# Altium footprint library EwgMicrochips.PcbLib: 61 footprints (part 4 of 4)
Each footprint in its own frame and in the unit in brackets; x right, y up, seen from the top. Pads: shape width x height; smd on the part's side, far side on the other; paste and mask are expansions set on the pad; w line width, h text height; cw(c..) or ccw(c..) is an arc to the next point about the centre after c.
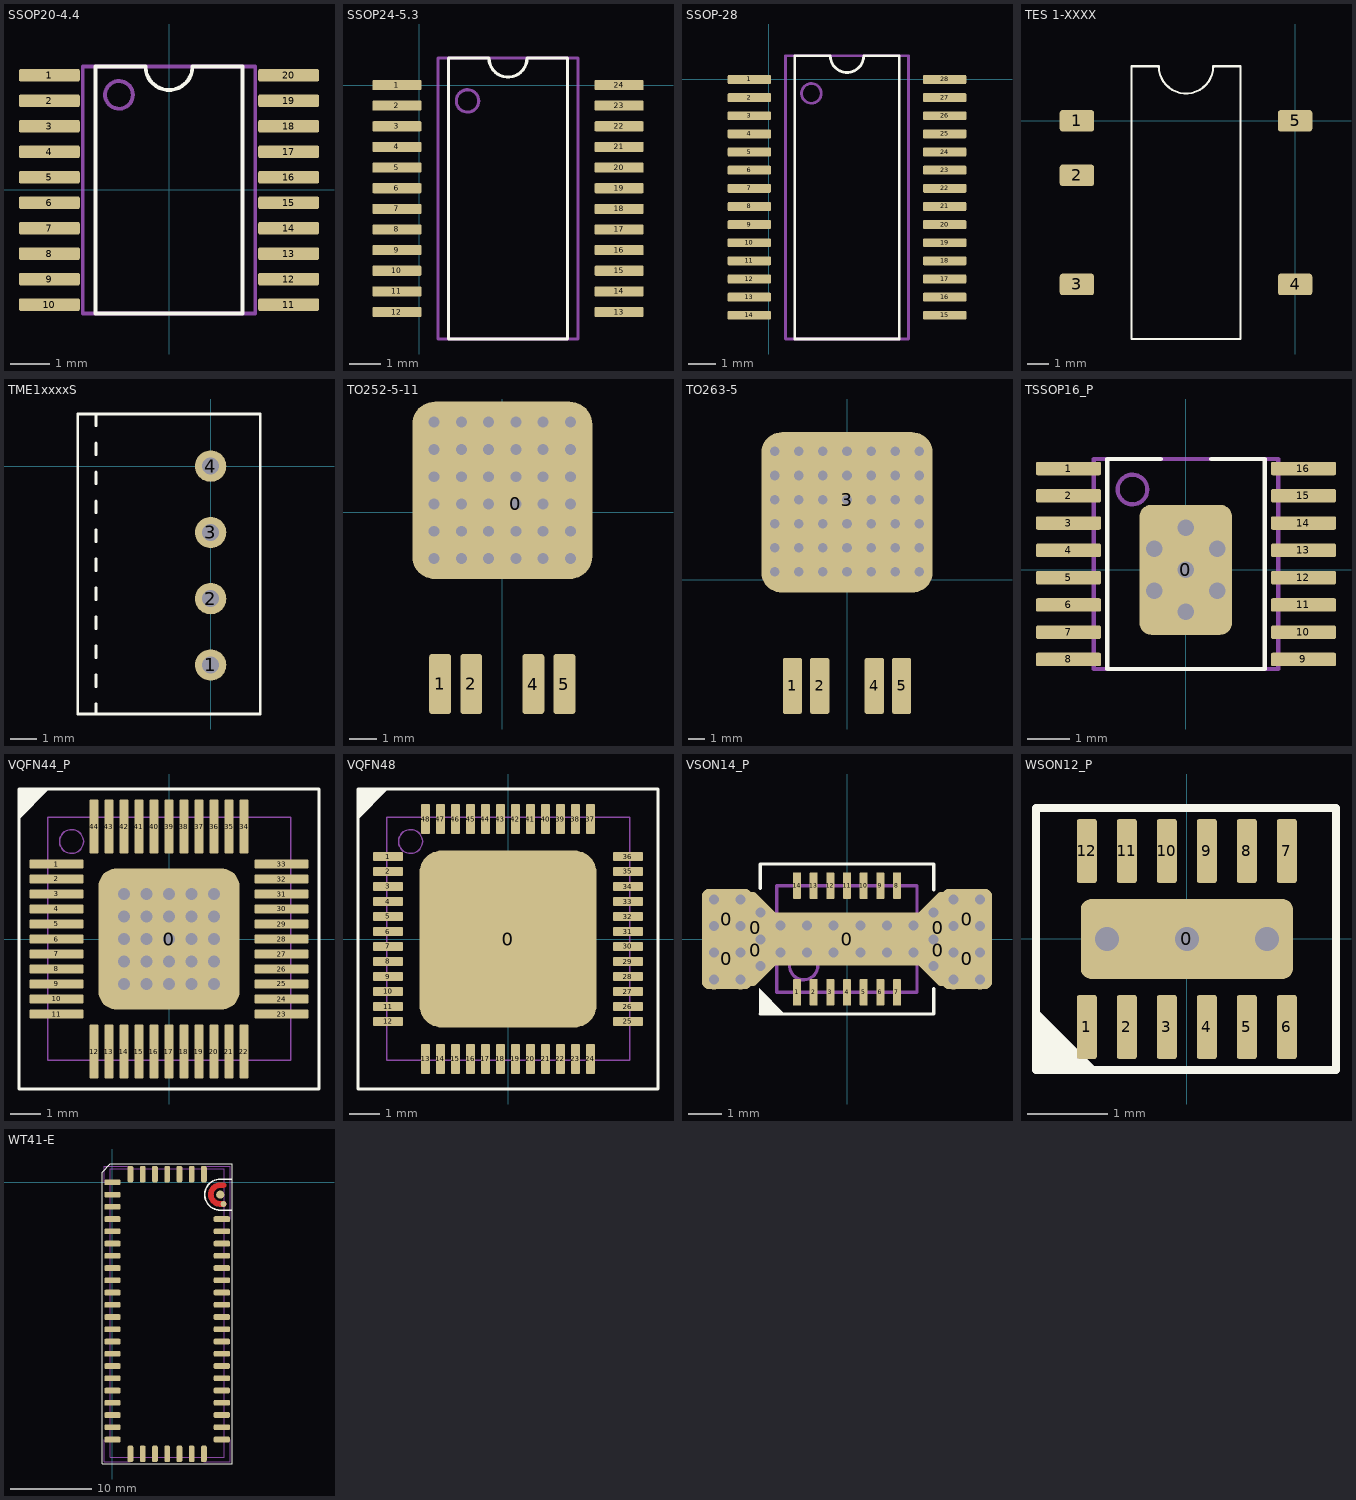
[diagram p3: the footprints below, top view; thin cyan lines are the x and y axes]

## SSOP20-4.4 [mm]
pads (20):
  rrect25% 1.55x0.32 smd: 1(-3.05,2.925) 2(-3.05,2.275) 3(-3.05,1.625) 4(-3.05,0.975) 5(-3.05,0.325) 6(-3.05,-0.325) 7(-3.05,-0.975) 8(-3.05,-1.625) 9(-3.05,-2.275) 10(-3.05,-2.925) 11(3.05,-2.925) 12(3.05,-2.275) 13(3.05,-1.625) 14(3.05,-0.975) 15(3.05,-0.325) 16(3.05,0.325) 17(3.05,0.975) 18(3.05,1.625) 19(3.05,2.275) 20(3.05,2.925)
Top Overlay:
  lines w0.1: -1.875,-3.15 -1.875,3.15 -0.6,3.15 ccw(c0,3.15) 0.6,3.15 1.875,3.15 1.875,-3.15 -1.875,-3.15
Mechanical 1:
  circle w0.1: c-1.275,2.425 r0.354
  lines w0.1: 0,-3.15 2.2,-3.15 ; -2.2,3.15 -2.2,0.65 -2.2,-3.15 2.2,-3.15 ; -2.2,3.15 0,3.15 ; -2.2,3.15 0,3.15 ; 0,3.15 2.2,3.15 2.2,0.65 2.2,-3.15
3D body: height 1.2, standoff 0, extent -3.2,-3.25 3.2,3.25

## SSOP24-5.3 [mm]
pads (24):
  rrect25% 1.55x0.32 smd: 1(-0.7,0) 2(-0.7,-0.65) 3(-0.7,-1.3) 4(-0.7,-1.95) 5(-0.7,-2.6) 6(-0.7,-3.25) 7(-0.7,-3.9) 8(-0.7,-4.55) 9(-0.7,-5.2) 10(-0.7,-5.85) 11(-0.7,-6.5) 12(-0.7,-7.15) 13(6.3,-7.15) 14(6.3,-6.5) 15(6.3,-5.85) 16(6.3,-5.2) 17(6.3,-4.55) 18(6.3,-3.9) 19(6.3,-3.25) 20(6.3,-2.6) 21(6.3,-1.95) 22(6.3,-1.3) 23(6.3,-0.65) 24(6.3,0)
Top Overlay:
  lines w0.1: 0.925,-8 0.925,0.85 1.575,0.85 2.2,0.85 ccw(c2.8,0.85) 3.4,0.85 4.025,0.85 4.675,0.85 4.675,-8 0.925,-8
Mechanical 1:
  circle w0.1: c1.525,-0.5 r0.354
  lines w0.1: 2.8,0.85 0.6,0.85 ; 0.6,0.85 0.6,-2.275 0.6,-8 5,-8 5,-2.275 5,0.85 2.175,0.85 0.6,0.85
3D body: height 2, standoff 0.01, extent -1.15,-7.9 6.75,0.73

## SSOP-28 [mm]
pads (28):
  rrect25% 1.55x0.32 smd: 1(-0.7,0) 2(-0.7,-0.65) 3(-0.7,-1.3) 4(-0.7,-1.95) 5(-0.7,-2.6) 6(-0.7,-3.25) 7(-0.7,-3.9) 8(-0.7,-4.55) 9(-0.7,-5.2) 10(-0.7,-5.85) 11(-0.7,-6.5) 12(-0.7,-7.15) 13(-0.7,-7.8) 14(-0.7,-8.45) 15(6.3,-8.45) 16(6.3,-7.8) 17(6.3,-7.15) 18(6.3,-6.5) 19(6.3,-5.85) 20(6.3,-5.2) 21(6.3,-4.55) 22(6.3,-3.9) 23(6.3,-3.25) 24(6.3,-2.6) 25(6.3,-1.95) 26(6.3,-1.3) 27(6.3,-0.65) 28(6.3,0)
Top Overlay:
  lines w0.1: 0.925,-9.3 0.925,0.85 1.575,0.85 2.2,0.85 ccw(c2.8,0.85) 3.4,0.85 4.025,0.85 4.675,0.85 4.675,-9.3 0.925,-9.3
Mechanical 1:
  circle w0.1: c1.525,-0.5 r0.354
  lines w0.1: 2.8,0.85 0.6,0.85 ; 0.6,0.85 0.6,-2.275 0.6,-9.3 5,-9.3 5,-2.275 5,0.85 2.175,0.85 0.6,0.85
3D body: height 1.97, standoff -0.03, extent -1.056,-9.325 6.756,0.875

## TES 1-XXXX [mm]
pads (5):
  rrect25% 1.6x1 smd: 1(-10.16,0) 2(-10.16,-2.54) 3(-10.16,-7.62) 4(0,-7.62) 5(0,0)
Top Overlay:
  lines w0.1: -7.62,-10.16 -2.54,-10.16 -2.54,2.54 -3.81,2.54 cw(c-5.08,2.54) -6.35,2.54 -7.62,2.54 -7.62,-10.16
3D body: height 7.05, standoff 0, extent -10.58,-10.66 0.42,3.04

## TME1xxxxS [mm] "SIP4"
height 10.5
pads (4):
  round 1.2 hole 0.65: 1(0,-7.62) 2(0,-5.08) 3(0,-2.54) 4(0,0)
Top Overlay:
  lines w0.1: -4.394,-9.5 -4.394,-9.11 ; -4.394,-8.45 -4.394,-7.999 ; -4.394,-7.339 -4.394,-6.888 ; -4.394,-6.228 -4.394,-5.777 ; -4.394,-5.117 -4.394,-4.666 ; -4.394,-4.006 -4.394,-3.555 ; -4.394,-2.895 -4.394,-2.444 ; -4.394,-1.784 -4.394,-1.333 ; -4.394,-0.673 -4.394,-0.222 ; -4.394,0.438 -4.394,0.889 ; -4.394,1.549 -4.394,2 ; -5.1,-9.5 -5.1,2 1.905,2 1.905,-9.5 -5.1,-9.5
Mechanical 1:
  lines w0.05: -5.1,-9.5 1.905,-9.5 1.905,2 -5.1,2 -5.1,-9.5
3D body: height 10.21, standoff -3.19, extent -4.345,-9.519 1.755,1.981

## TO252-5-11 [mm]
pads (5):
  rrect25% 6.6x6.5 hole 0.4 copper offset -0.5,0.5: 0(0.5,0.3)
  rrect25% 0.8x2.2 smd: 1(-2.28,-6.3) 2(-1.14,-6.3) 4(1.14,-6.3) 5(2.28,-6.3)
via -0.5,1.3 diameter 0.7 hole 0.4
via 1.5,-1.7 diameter 0.7 hole 0.4
via 0.5,-1.7 diameter 0.7 hole 0.4
via -0.5,-1.7 diameter 0.7 hole 0.4
via -1.5,-1.7 diameter 0.7 hole 0.4
via -2.5,-1.7 diameter 0.7 hole 0.4
via -2.5,-0.7 diameter 0.7 hole 0.4
via -1.5,-0.7 diameter 0.7 hole 0.4
via -0.5,-0.7 diameter 0.7 hole 0.4
via 0.5,-0.7 diameter 0.7 hole 0.4
via 1.5,-0.7 diameter 0.7 hole 0.4
via 1.5,0.3 diameter 0.7 hole 0.4
via -1.5,0.3 diameter 0.7 hole 0.4
via -2.5,0.3 diameter 0.7 hole 0.4
via -2.5,1.3 diameter 0.7 hole 0.4
via -1.5,1.3 diameter 0.7 hole 0.4
via 1.5,1.3 diameter 0.7 hole 0.4
via 0.5,1.3 diameter 0.7 hole 0.4
via 0.5,2.3 diameter 0.7 hole 0.4
via 1.5,2.3 diameter 0.7 hole 0.4
via -0.5,2.3 diameter 0.7 hole 0.4
via -2.5,2.3 diameter 0.7 hole 0.4
via -1.5,2.3 diameter 0.7 hole 0.4
via -2.5,3.3 diameter 0.7 hole 0.4
via -1.5,3.3 diameter 0.7 hole 0.4
via -0.5,3.3 diameter 0.7 hole 0.4
via 1.5,3.3 diameter 0.7 hole 0.4
via 0.5,3.3 diameter 0.7 hole 0.4
via 2.5,3.3 diameter 0.7 hole 0.4
via 2.5,2.3 diameter 0.7 hole 0.4
via 2.5,1.3 diameter 0.7 hole 0.4
via 2.5,0.3 diameter 0.7 hole 0.4
via 2.5,-0.7 diameter 0.7 hole 0.4
via 2.5,-1.7 diameter 0.7 hole 0.4
via -0.5,0.3 diameter 0.7 hole 0.4
3D body: height 2.3, standoff 0, extent -3.25,-6.5 3.25,3.4

## TO263-5 [mm]
pads (5):
  rrect25% 1.2x3.5 smd: 1(-3.4,-6.6) 2(-1.7,-6.6) 4(1.7,-6.6) 5(3.4,-6.6)
  rrect25% 10.66x10 hole 0.6 copper offset 0,-0.8: 3(0,5)
via 3,8 diameter 0.6 hole 0.6
via 4.5,8 diameter 0.6 hole 0.6
via 1.5,8 diameter 0.6 hole 0.6
via 0,8 diameter 0.6 hole 0.6
via -1.5,8 diameter 0.6 hole 0.6
via 0,6.5 diameter 0.6 hole 0.6
via -1.5,6.5 diameter 0.6 hole 0.6
via 1.5,6.5 diameter 0.6 hole 0.6
via 4.5,6.5 diameter 0.6 hole 0.6
via 3,6.5 diameter 0.6 hole 0.6
via 3,5 diameter 0.6 hole 0.6
via 4.5,5 diameter 0.6 hole 0.6
via 3,3.5 diameter 0.6 hole 0.6
via -1.5,5 diameter 0.6 hole 0.6
via -1.5,3.5 diameter 0.6 hole 0.6
via 0,3.5 diameter 0.6 hole 0.6
via 4.5,3.5 diameter 0.6 hole 0.6
via 4.5,2 diameter 0.6 hole 0.6
via 3,2 diameter 0.6 hole 0.6
via 1.5,2 diameter 0.6 hole 0.6
via 0,2 diameter 0.6 hole 0.6
via -1.5,2 diameter 0.6 hole 0.6
via -1.5,0.5 diameter 0.6 hole 0.6
via 0,0.5 diameter 0.6 hole 0.6
via 1.5,0.5 diameter 0.6 hole 0.6
via 3,0.5 diameter 0.6 hole 0.6
via 4.5,0.5 diameter 0.6 hole 0.6
via 1.5,5 diameter 0.6 hole 0.6
via 1.5,3.5 diameter 0.6 hole 0.6
via -3,0.5 diameter 0.6 hole 0.6
via -4.5,0.5 diameter 0.6 hole 0.6
via -4.5,2 diameter 0.6 hole 0.6
via -3,2 diameter 0.6 hole 0.6
via -3,3.5 diameter 0.6 hole 0.6
via -4.5,3.5 diameter 0.6 hole 0.6
via -4.5,5 diameter 0.6 hole 0.6
via -3,5 diameter 0.6 hole 0.6
via -4.5,6.5 diameter 0.6 hole 0.6
via -3,6.5 diameter 0.6 hole 0.6
via -4.5,8 diameter 0.6 hole 0.6
via -3,8 diameter 0.6 hole 0.6
3D body: height 4.78, standoff -0.02, extent -5,-7.5 5,8.17

## TSSOP16_P [mm]
pads (17):
  rrect25% 2.2x3.1 all layers, no hole: 0(0,0)
  rrect25% 1.55x0.32 smd: 1(-2.794,2.413) 2(-2.794,1.763) 3(-2.794,1.113) 4(-2.794,0.463) 5(-2.794,-0.187) 6(-2.794,-0.837) 7(-2.794,-1.487) 8(-2.794,-2.137) 9(2.806,-2.137) 10(2.806,-1.487) 11(2.806,-0.837) 12(2.806,-0.187) 13(2.806,0.463) 14(2.806,1.113) 15(2.806,1.763) 16(2.806,2.413)
via -0.75,0.5 diameter 0.6 hole 0.4
via 0.75,0.5 diameter 0.6 hole 0.4
via 0,1 diameter 0.6 hole 0.4
via 0.75,-0.5 diameter 0.6 hole 0.4
via -0.75,-0.5 diameter 0.6 hole 0.4
via 0,-1 diameter 0.6 hole 0.4
via 0,0 diameter 0.6 hole 0.4
Top Overlay:
  lines w0.1: -0.594,2.638 -1.869,2.638 -1.869,-2.362 1.881,-2.362 1.881,2.638 0.606,2.638
Mechanical 1:
  circle w0.1: c-1.269,1.913 r0.354
  lines w0.1: -2.194,2.638 0.006,2.638 ; -2.194,2.638 0.006,2.638 ; -2.194,2.638 -2.194,0.138 -2.194,-2.362 0.006,-2.362 2.206,-2.362 2.206,0.138 2.206,2.638 0.006,2.638
3D body: height 1.2, standoff 0, extent -3.244,-2.412 3.256,2.688

## VQFN44_P [mm]
pads (45):
  rrect25% 4.7x4.7 all layers, no hole: 0(0,0)
  rrect25% 1.8x0.3 smd: 1(-3.75,2.5) 2(-3.75,2) 3(-3.75,1.5) 4(-3.75,1) 5(-3.75,0.5) 6(-3.75,0) 7(-3.75,-0.5) 8(-3.75,-1) 9(-3.75,-1.5) 10(-3.75,-2) 11(-3.75,-2.5) 23(3.75,-2.5) 24(3.75,-2) 25(3.75,-1.5) 26(3.75,-1) 27(3.75,-0.5) 28(3.75,0) 29(3.75,0.5) 30(3.75,1) 31(3.75,1.5) 32(3.75,2) 33(3.75,2.5)
  rrect25% 0.3x1.8 smd: 12(-2.5,-3.75) 13(-2,-3.75) 14(-1.5,-3.75) 15(-1,-3.75) 16(-0.5,-3.75) 17(0,-3.75) 18(0.5,-3.75) 19(1,-3.75) 20(1.5,-3.75) 21(2,-3.75) 22(2.5,-3.75) 34(2.5,3.75) 35(2,3.75) 36(1.5,3.75) 37(1,3.75) 38(0.5,3.75) 39(0,3.75) 40(-0.5,3.75) 41(-1,3.75) 42(-1.5,3.75) 43(-2,3.75) 44(-2.5,3.75)
via 0,1.5 diameter 0.6 hole 0.4
via 1.5,0 diameter 0.6 hole 0.4
via 1.5,-1.5 diameter 0.6 hole 0.4
via 1.5,-0.75 diameter 0.6 hole 0.4
via 0.75,-0.75 diameter 0.6 hole 0.4
via 0.75,-1.5 diameter 0.6 hole 0.4
via 0,-1.5 diameter 0.6 hole 0.4
via 0,-0.75 diameter 0.6 hole 0.4
via -0.75,-0.75 diameter 0.6 hole 0.4
via -0.75,-1.5 diameter 0.6 hole 0.4
via -1.5,-1.5 diameter 0.6 hole 0.4
via -1.5,-0.75 diameter 0.6 hole 0.4
via 1.5,1.5 diameter 0.6 hole 0.4
via 1.5,0.75 diameter 0.6 hole 0.4
via 0.75,0 diameter 0.6 hole 0.4
via 0.75,0.75 diameter 0.6 hole 0.4
via 0.75,1.5 diameter 0.6 hole 0.4
via 0,0.75 diameter 0.6 hole 0.4
via -0.75,0.75 diameter 0.6 hole 0.4
via -0.75,1.5 diameter 0.6 hole 0.4
via -1.5,1.5 diameter 0.6 hole 0.4
via -1.5,0.75 diameter 0.6 hole 0.4
via -1.5,0 diameter 0.6 hole 0.4
via -0.75,0 diameter 0.6 hole 0.4
via 0,0 diameter 0.6 hole 0.4
Top Overlay:
  region: -5,5 -4,5 -5,4
  lines w0.1: -5,4.75 -4.75,5 ; -5,-5 -5,5 5,5 5,-5 -5,-5
Mechanical 1:
  circle w0.05: c-3.25,3.25 r0.4
  lines w0.05: -4.05,-4.05 -4.05,4.05 4.05,4.05 4.05,-4.05 -4.05,-4.05
3D body: height 0.9, standoff 0, extent -3.501,-3.501 3.501,3.501

## VQFN48 [mm]
pads (49):
  rrect25% 5.9x5.9 smd: 0(0,0)
  rrect25% 1x0.3 smd: 1(-4,2.75) 2(-4,2.25) 3(-4,1.75) 4(-4,1.25) 5(-4,0.75) 6(-4,0.25) 7(-4,-0.25) 8(-4,-0.75) 9(-4,-1.25) 10(-4,-1.75) 11(-4,-2.25) 12(-4,-2.75) 25(4,-2.75) 26(4,-2.25) 27(4,-1.75) 28(4,-1.25) 29(4,-0.75) 30(4,-0.25) 31(4,0.25) 32(4,0.75) 33(4,1.25) 34(4,1.75) 35(4,2.25) 36(4,2.75)
  rrect25% 0.3x1 smd: 13(-2.75,-4) 14(-2.25,-4) 15(-1.75,-4) 16(-1.25,-4) 17(-0.75,-4) 18(-0.25,-4) 19(0.25,-4) 20(0.75,-4) 21(1.25,-4) 22(1.75,-4) 23(2.25,-4) 24(2.75,-4) 37(2.75,4) 38(2.25,4) 39(1.75,4) 40(1.25,4) 41(0.75,4) 42(0.25,4) 43(-0.25,4) 44(-0.75,4) 45(-1.25,4) 46(-1.75,4) 47(-2.25,4) 48(-2.75,4)
Top Overlay:
  region: -5,5 -4,5 -5,4
  lines w0.1: -5,4.75 -4.75,5 ; -5,-5 5,-5 5,5 -5,5 -5,-5
Mechanical 1:
  circle w0.05: c-3.25,3.25 r0.4
  lines w0.05: -4.05,-4.05 4.05,-4.05 4.05,4.05 -4.05,4.05 -4.05,-4.05
3D body: height 0.8, standoff -0.01, extent -4.05,-4.05 4.05,4.05

## VSON14_P [mm]
pads (23):
  rrect25% 1.5x1.8 all layers, no hole: 0(-3.6,-0.6) 0(-3.6,0.6) 0(3.6,-0.6) 0(3.6,0.6)
  rrect25% 1.5x1.8 all layers, no hole rot 135: 0(-2.743,-0.33) 0(2.743,0.33)
  rrect25% 1.5x1.8 all layers, no hole rot 45: 0(-2.743,0.33) 0(2.743,-0.33)
  rrect25% 4.8x1.58 all layers, no hole: 0(0,0)
  rrect25% 0.24x0.8 smd: 1(-1.5,-1.6) 2(-1,-1.6) 3(-0.5,-1.6) 4(0,-1.6) 5(0.5,-1.6) 6(1,-1.6) 7(1.5,-1.6) 8(1.5,1.6) 9(1,1.6) 10(0.5,1.6) 11(0,1.6) 12(-0.5,1.6) 13(-1,1.6) 14(-1.5,1.6)
via -1.2,-0.4 diameter 0.6 hole 0.3
via -1.2,0.4 diameter 0.6 hole 0.3
via -2,0.4 diameter 0.6 hole 0.3
via -2,-0.4 diameter 0.6 hole 0.3
via 1.2,0.4 diameter 0.6 hole 0.3
via 1.2,-0.4 diameter 0.6 hole 0.3
via 0.4,-0.4 diameter 0.6 hole 0.3
via 0.4,0.4 diameter 0.6 hole 0.3
via -0.4,0.4 diameter 0.6 hole 0.3
via -0.4,-0.4 diameter 0.6 hole 0.3
via -3.996,0.39 diameter 0.6 hole 0.3
via -3.996,-0.41 diameter 0.6 hole 0.3
via -3.996,-1.21 diameter 0.6 hole 0.3
via -3.996,1.19 diameter 0.6 hole 0.3
via -3.19,1.184 diameter 0.6 hole 0.3
via -3.196,-1.21 diameter 0.6 hole 0.3
via -3.196,-0.41 diameter 0.6 hole 0.3
via -3.196,0.39 diameter 0.6 hole 0.3
via -2.596,0.79 diameter 0.6 hole 0.3
via -2.596,-0.01 diameter 0.6 hole 0.3
via -2.596,-0.81 diameter 0.6 hole 0.3
via 2.596,-0.81 diameter 0.6 hole 0.3
via 2.596,-0.01 diameter 0.6 hole 0.3
via 2.596,0.79 diameter 0.6 hole 0.3
via 3.196,0.39 diameter 0.6 hole 0.3
via 3.196,-0.41 diameter 0.6 hole 0.3
via 3.196,-1.21 diameter 0.6 hole 0.3
via 3.19,1.184 diameter 0.6 hole 0.3
via 3.996,1.19 diameter 0.6 hole 0.3
via 3.996,-1.21 diameter 0.6 hole 0.3
via 3.996,-0.41 diameter 0.6 hole 0.3
via 3.996,0.39 diameter 0.6 hole 0.3
via 2,-0.4 diameter 0.6 hole 0.3
via 2,0.4 diameter 0.6 hole 0.3
Top Overlay:
  region: -2.634,-1.481 -1.862,-2.253 -2.634,-2.253
  lines w0.1: -2.6,-2.25 2.6,-2.25 2.6,-1.489 ; -2.6,1.515 -2.6,2.25 -0.35,2.25 2.6,2.25 2.6,1.482
Mechanical 1:
  circle w0.1: c-1.3,-0.8 r0.424
  lines w0.1: -2.11,-1.6 2.1,-1.6 2.1,1.6 0.3,1.6 -2.11,1.6 -2.11,-1.6
3D body: height 1.1, standoff 0.05, extent -2.11,-1.6 2.1,1.61

## WSON12_P [mm]
pads (13):
  rrect25% 2.65x1 all layers, no hole: 0(0,0)
  rrect25% 0.25x0.8 smd: 1(-1.25,-1.1) 2(-0.75,-1.1) 3(-0.25,-1.1) 4(0.25,-1.1) 5(0.75,-1.1) 6(1.25,-1.1) 7(1.25,1.1) 8(0.75,1.1) 9(0.25,1.1) 10(-0.25,1.1) 11(-0.75,1.1) 12(-1.25,1.1)
via 0,0 diameter 0.6 hole 0.3
via -1,0 diameter 0.6 hole 0.3
via 1,0 diameter 0.6 hole 0.3
Top Overlay:
  region: -1.886,-0.864 -1.114,-1.636 -1.886,-1.636
  lines w0.1: 1.864,1.636 -1.886,1.636 -1.886,-1.636 1.864,-1.636 1.864,1.636 ; 1.864,1.636 1.864,1.636
3D body: height 0.8, standoff 0, extent -1.5,-1 1.5,1

## WT41-E [mm]
pads (57):
  rrect50% 2x0.7 smd: 2(0,0) 3(0,-1.5) 4(0,-3) 5(0,-4.5) 6(0,-6) 7(0,-7.5) 8(0,-9) 9(0,-10.5) 10(0,-12) 11(0,-13.5) 12(0,-15) 13(0,-16.5) 14(0,-18) 15(0,-19.5) 16(0,-21) 17(0,-22.5) 18(0,-24) 19(0,-25.5) 20(0,-27) 21(0,-28.5) 22(0,-30) 23(0,-31.5) 31(13.4,-31.5) 32(13.4,-30) 33(13.4,-28.5) 34(13.4,-27) 35(13.4,-25.5) 36(13.4,-24) 37(13.4,-22.5) 38(13.4,-21) 39(13.4,-19.5) 40(13.4,-18) 41(13.4,-16.5) 42(13.4,-15) 43(13.4,-13.5) 44(13.4,-12) 45(13.4,-10.5) 46(13.4,-9) 47(13.4,-7.5) 48(13.4,-6) 49(13.4,-4.5)
  rrect50% 0.7x2 smd: 24(2.2,-33.25) 25(3.7,-33.25) 26(5.2,-33.25) 27(6.7,-33.25) 28(8.2,-33.25) 29(9.7,-33.25) 30(11.2,-33.25) 53(11.2,1) 54(9.7,1) 55(8.2,1) 56(6.7,1) 57(5.2,1) 58(3.7,1) 59(2.2,1)
  round 0.7 smd: 50(13.6,-2.65)
  round 1 smd: 51(13.2,-1.5)
Top Layer:
  lines w0.7: 13.6,-2.65 13.2,-2.65 cw(c13.2,-1.5) 13.2,-0.35 13.6,-0.35
Top Overlay:
  lines w0.1: -1.25,-34.5 -1.25,1.25 -0.25,2.25 14.65,2.25 14.65,-33.9 14.65,-34.5 -1.25,-34.5
  lines w0.2: 14.6,-3.4 14.6,-3.401 13.2,-3.401 cw(c13.2,-1.5) 13.2,0.401 14.6,0.401 ; 14.6,0.4 14.6,0.401
Mechanical 1:
  lines w0.1: -1,-31.5 -1,-34.25 2.2,-34.25 ; -1,-0.05 -1,2 2.2,2 ; 11.2,-34.25 14.4,-34.25 14.4,-31.5 ; 11.2,2 14.4,2 14.4,-4.5 ; -0.3,-33.65 -0.3,1.65 13.7,1.65 13.7,-33.65 -0.3,-33.65
3D body: height 3.45, standoff 0, extent -0.3,-33.65 13.7,1.65